# Altium footprint library RevA2.PcbLib: 57 footprints (part 1 of 4)
Each footprint in its own frame and in the unit in brackets; x right, y up, seen from the top. Pads: shape width x height; smd on the part's side, far side on the other; paste and mask are expansions set on the pad; w line width, h text height; cw(c..) or ccw(c..) is an arc to the next point about the centre after c.
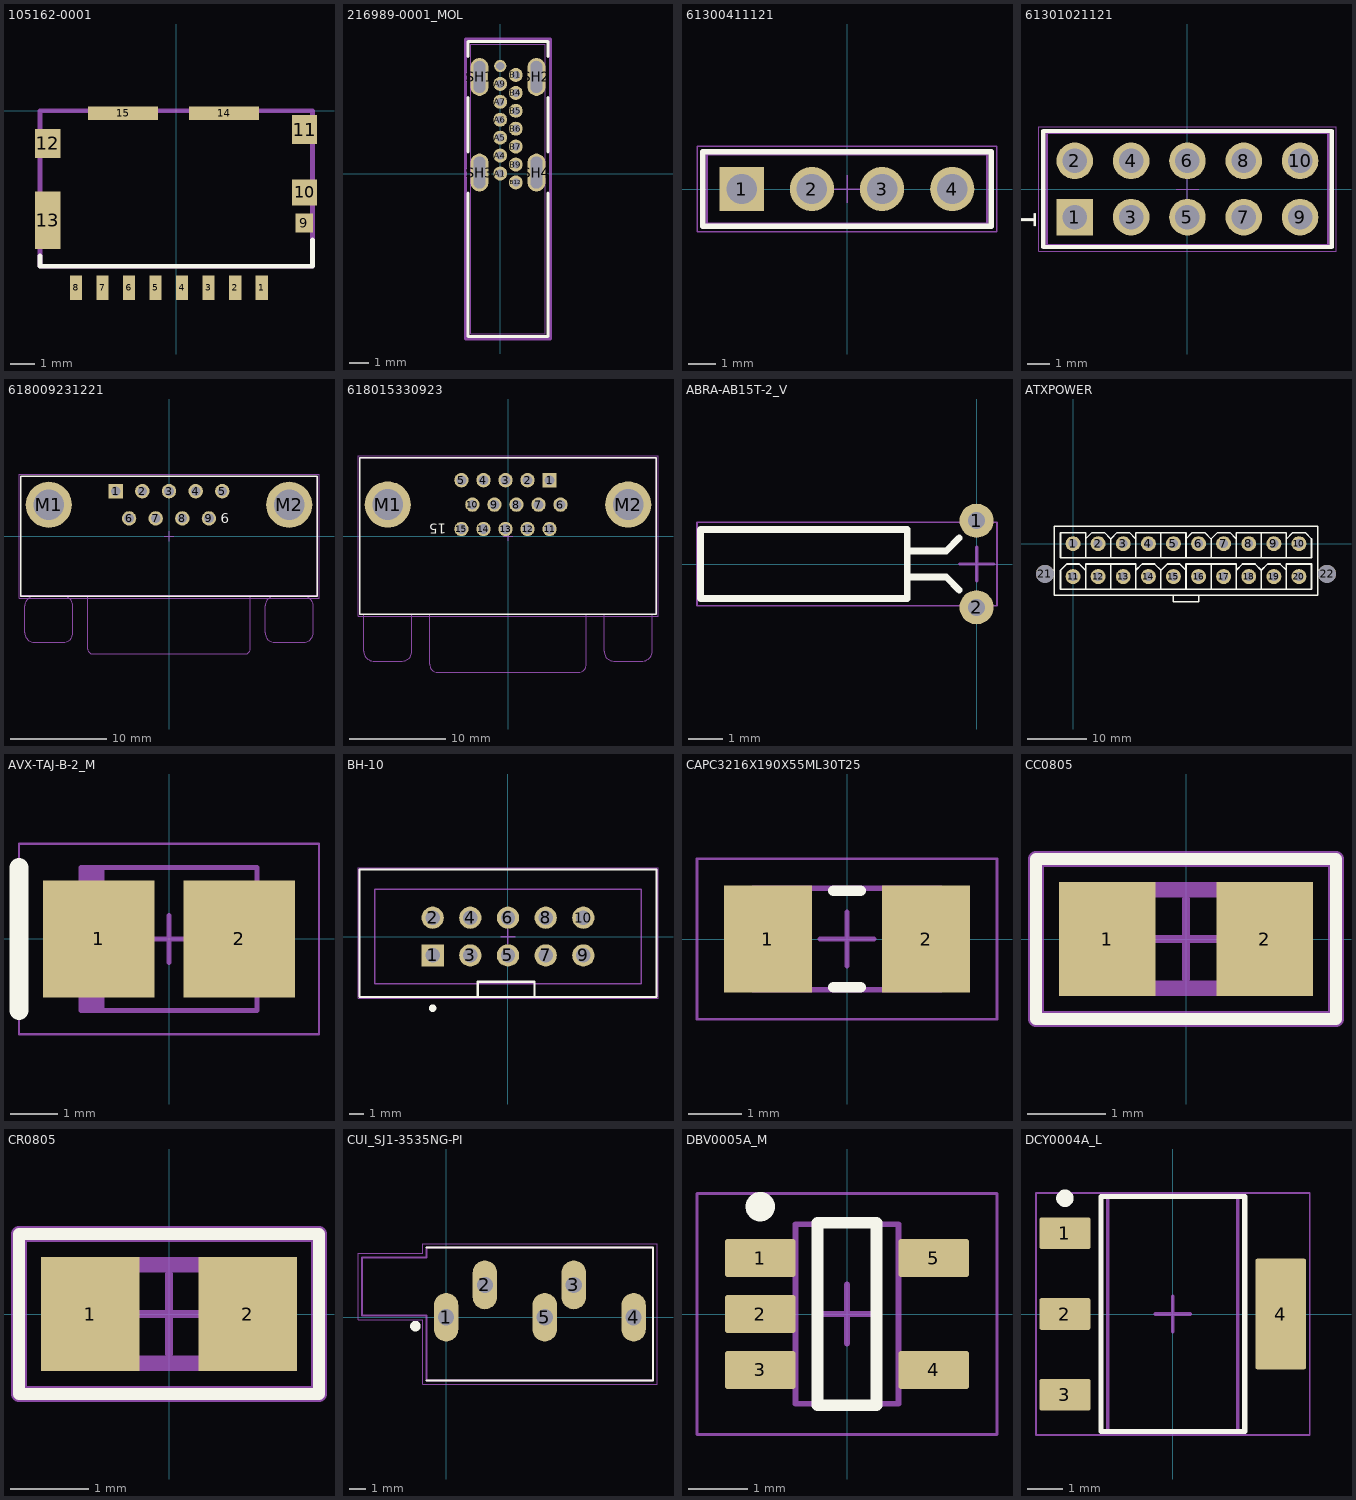
[diagram p0: the footprints below, top view; thin cyan lines are the x and y axes]

## 105162-0001 [mm]
height 2.8
pads (15):
  rect 0.5x1 smd: 1(3.55,-7.34) 2(2.45,-7.34) 3(1.35,-7.34) 4(0.25,-7.34) 5(-0.85,-7.34) 6(-1.95,-7.34) 7(-3.05,-7.34) 8(-4.15,-7.34)
  rect 0.72x0.78 smd: 9(5.31,-4.66)
  rect 1.05x1.08 smd: 10(5.325,-3.39)
  rect 1.05x1.2 smd: 11(5.325,-0.78) 12(-5.325,-1.35)
  rect 1.05x2.39 smd: 13(-5.325,-4.535)
  rect 2.91x0.55 smd: 14(1.986,-0.105) 15(-2.204,-0.105)
Top Overlay:
  lines w0.2: -5.65,-6.028 -5.65,-6.45 5.65,-6.45 5.65,-5.355
Mechanical 13:
  lines w0.2: -5.65,-6.45 5.65,-6.45 5.65,0 -5.65,0 -5.65,-6.45
3D body "1051620001--3DModel-STEP-56544.STEP": height 1.45, standoff 0, extent -5.65,-7.61 5.65,-0.01

## 216989-0001_MOL [mm]
height 3.6
pads (18):
  round 0.7 hole 0.4 mask+0: A1(0,0) A4(0,0.9) A5(0,1.8) A6(0,2.7) A7(0,3.6) A9(0,4.5) B1(0.78,4.95) B4(0.78,4.05) B5(0.78,3.15) B6(0.78,2.25) B7(0.78,1.35) B9(0.78,0.45) B12(0.78,-0.45)
  round 0.61 hole 0.406 mask+0: A12(0,5.4)
  oval 0.9x1.9 hole 0.6 slot 1.6 at 90 deg: SH1(-1.04,4.85) SH2(1.82,4.85) SH3(-1.04,0.05) SH4(1.82,0.05)
Top Overlay:
  lines w0.152: -1.617,-0.979 -1.617,-8.181 2.397,-8.181 2.397,-0.979 ; -1.617,1.079 -1.617,3.821 ; -1.617,5.879 -1.617,6.627 2.397,6.627 2.397,5.879 ; 2.397,1.079 2.397,3.821
Mechanical 13:
  lines w0.025: -1.49,-8.054 2.27,-8.054 2.27,6.5 -1.49,6.5 -1.49,-8.054
Mechanical 15:
  lines w0.152: -1.744,-8.308 -1.744,6.754 2.524,6.754 2.524,-8.308 -1.744,-8.308
3D body: height 0.25, standoff 0, extent 0,0 0.254,0.254
3D body "2169890001.stp": height 9.07, standoff -2.47, extent -1.481,-8.027 2.279,6.623

## 61300411121 [mm] "Pin Header, pitch 2.54 mm, THT, Vertical, single row, 4p"
height 8.54
pads (4):
  rect 1.6x1.6 hole 1.1: 1(-3.81,0)
  round 1.6 hole 1.1: 2(-1.27,0) 3(1.27,0) 4(3.81,0)
Top Overlay:
  lines w0.2: -5.23,-1.345 -5.23,1.345 5.23,1.345 5.23,-1.345 -5.23,-1.345
Mechanical 13:
  lines w0.1: -5.08,-1.27 5.08,-1.27 5.08,1.27 -5.08,1.27 -5.08,-1.27
Mechanical 15:
  lines w0.05: -0.5,0 0.5,0 ; 0,-0.5 0,0.5 ; -5.43,-1.545 5.43,-1.545 5.43,1.545 -5.43,1.545 -5.43,-1.545
3D body "61300411121.stp": height 8.57, standoff -2.97, extent -5.08,-1.27 5.08,1.27

## 61301021121 [mm] "Pin Header, pitch 2.54 mm, THT, Vertical, dual row, 10p"
height 8.54
pads (10):
  rect 1.65x1.65 hole 1.1: 1(-5.08,-1.27)
  round 1.65 hole 1.1: 2(-5.08,1.27) 3(-2.54,-1.27) 4(-2.54,1.27) 5(0,-1.27) 6(0,1.27) 7(2.54,-1.27) 8(2.54,1.27) 9(5.08,-1.27) 10(5.08,1.27)
Top Overlay:
  lines w0.2: -6.5,-2.615 -6.5,2.615 6.5,2.615 6.5,-2.615 -6.5,-2.615
  text "1" at -6.83,-1.853 h1.02
Mechanical 13:
  lines w0.1: -6.35,-2.54 -6.35,2.54 6.35,2.54 6.35,-2.54 -6.35,-2.54
Mechanical 15:
  lines w0.05: -0.5,0 0.5,0 ; 0,-0.5 0,0.5 ; -6.7,-2.815 6.7,-2.815 6.7,2.815 -6.7,2.815 -6.7,-2.815
3D body "61301021121.stp": height 8.59, standoff -2.95, extent -6.35,-2.54 6.35,2.54

## 618009231221 [mm] "9 pins, right angled, 8.08mm, with hex screw"
height 12.5
pads (11):
  rect 1.5x1.5 hole 1: 1(-5.54,4.69)
  round 1.5 hole 1: 2(-2.77,4.69) 3(0,4.69) 4(2.77,4.69) 5(5.54,4.69) 6(-4.155,1.85) 7(-1.385,1.85) 8(1.385,1.85) 9(4.155,1.85)
  round 4.8 hole 3.2: M1(-12.5,3.27) M2(12.5,3.27)
Top Overlay:
  lines w0.15: -15.4,-6.25 -15.4,6.25 15.4,6.25 15.4,-6.25 -15.4,-6.25
  text "9" at 6.29,2.38 h1.02
Mechanical 2:
  lines w0.1: -15.4,-6.15 15.4,-6.15
  text "PCB Edge" at 0,0 h1.02
Mechanical 13:
  lines w0.1: -14,-6.25 ccw(c-14,-7.25) -15,-7.25 -15,-10.05 ccw(c-14,-10.05) -14,-11.05 -11,-11.05 ccw(c-11,-10.05) -10,-10.05 -10,-7.25 ccw(c-11,-7.25) -11,-6.25 ; -8.46,-6.25 -8.46,-11.73 ccw(c-7.96,-11.73) -7.96,-12.23 7.94,-12.23 ; 7.96,-12.23 ccw(c7.96,-11.73) 8.46,-11.73 8.46,-6.25 ; 11,-6.25 ccw(c11,-7.25) 10,-7.25 10,-10.05 ccw(c11,-10.05) 11,-11.05 14,-11.05 ccw(c14,-10.05) 15,-10.05 15,-7.25 ccw(c14,-7.25) 14,-6.25 ; -15.4,-6.25 15.4,-6.25 15.4,6.25 -15.4,6.25 -15.4,-6.25 ; 7.95,-12.23 7.95,-12.23
Mechanical 15:
  lines w0.05: -0.5,0 0.5,0 ; 0,-0.5 0,0.5 ; -15.6,-6.45 15.6,-6.45 15.6,6.45 -15.6,6.45 -15.6,-6.45
3D body "618009231221.stp": height 12.55, standoff -3.8, extent -15.405,-12.25 15.405,6.25

## 618015330923 [mm] "15 pins, right angled"
height 12.5
pads (17):
  rect 1.5x1.5 hole 1: 1(4.32,5.82)
  round 1.5 hole 1: 2(2.03,5.82) 3(-0.26,5.82) 4(-2.55,5.82) 5(-4.84,5.82) 6(5.46,3.28) 7(3.17,3.28) 8(0.88,3.28) 9(-1.41,3.28) 10(-3.7,3.28) 11(4.32,0.74) 12(2.03,0.74) 13(-0.26,0.74) 14(-2.55,0.74) 15(-4.84,0.74)
  round 4.8 hole 3.2: M1(-12.5,3.28) M2(12.5,3.28)
Top Overlay:
  lines w0.15: -15.4,-8.15 15.4,-8.15 15.4,8.15 -15.4,8.15 -15.4,-8.15
  text "15" at -6.43,1.27 h1.02
Mechanical 2:
  lines w0.1: -15.4,-8.15 15.4,-8.15
  text "PCB Edge" at 0,0 h1.02
Mechanical 13:
  lines w0.1: -15,-8.15 -15,-11.99 ccw(c-14,-11.99) -14,-12.99 -11,-12.99 ccw(c-11,-11.99) -10,-11.99 -10,-8.15 ; -8.15,-8.15 -8.15,-13.35 ccw(c-7.35,-13.35) -7.35,-14.15 7.35,-14.15 ccw(c7.35,-13.35) 8.15,-13.35 8.15,-8.15 ; 10,-8.15 10,-11.99 ccw(c11,-11.99) 11,-12.99 14,-12.99 ccw(c14,-11.99) 15,-11.99 15,-8.15 ; -15.4,-8.15 -15.4,8.15 15.4,8.15 15.4,-8.15 -15.4,-8.15
Mechanical 15:
  lines w0.05: -0.5,0 0.5,0 ; 0,-0.5 0,0.5 ; -15.6,-8.35 15.6,-8.35 15.6,8.35 -15.6,8.35 -15.6,-8.35
3D body "618015330923.stp": height 12.55, standoff -3.95, extent -15.4,-14.15 15.4,8.15

## ABRA-AB15T-2_V [mm] "THD, 2-Leads, Body 5.1x1.5mm, Height 1.5mm"
height 1.5
pads (2):
  round 1 hole 0.5: 1(0,1.27) 2(0,-1.27)
Top Overlay:
  lines w0.2: -2.032,-0.381 -0.889,-0.381 -0.508,-0.762 ; -2.032,0.381 -0.889,0.381 -0.508,0.762 ; -8.1,-1.016 -8.1,1.016 -2.032,1.016 -2.032,-1.016 -8.1,-1.016
Mechanical 13:
  lines w0.1: -8.1,-1.016 -8.1,1.016 -2.032,1.016 -2.032,-1.016 -8.1,-1.016
Mechanical 15:
  lines w0.05: -8.2,-1.227 0.6,-1.227 0.6,1.227 -8.2,1.227 -8.2,-1.227
  lines w0.1: -0.5,0 0.5,0 ; 0,-0.5 0,0.5
3D body "User Library-XTAL.step": height 2.15, standoff -1.77, extent -8.285,-1.392 0.096,1.39

## ATXPOWER [mm]
pads (22):
  round 2.5 hole 1.5: 1(0,0) 2(4.2,0) 3(8.4,0) 4(12.6,0) 5(16.8,0) 6(21,0) 7(25.2,0) 8(29.4,0) 9(33.6,0) 10(37.8,0) 11(0,-5.5) 12(4.2,-5.5) 13(8.4,-5.5) 14(12.6,-5.5) 15(16.8,-5.5) 16(21,-5.5) 17(25.2,-5.5) 18(29.4,-5.5) 19(33.6,-5.5) 20(37.8,-5.5)
  round 3 hole 3 unplated: 21(-4.7,-5.04) 22(42.5,-5.04)
Top Overlay:
  lines w0.254: -3.65,-4.376 ccw(c-4.6,-4.97) -3.598,-5.472 ; -3.556,-5.334 -3.175,-5.334 ; -3.556,-4.445 -3.175,-4.445 ; 2.1,0.8 3.15,1.85 5.25,1.85 6.3,0.8 ; 10.5,-4.45 11.55,-3.4 13.65,-3.4 14.7,-4.45 ; 16.8,-8.65 16.8,-9.7 21,-9.7 21,-8.65 ; 41.021,-5.334 41.402,-5.334 ; 41.021,-4.445 41.402,-4.445 ; 41.444,-5.472 ccw(c42.446,-4.97) 41.496,-4.376 ; 2.1,-7.6 2.1,-4.45 ; 2.1,-7.6 -2.1,-7.6 -2.1,-4.45 -1.05,-3.4 1.05,-3.4 2.1,-4.45 ; 2.1,-7.6 6.3,-7.6 ; 2.1,-4.45 2.1,-3.4 6.3,-3.4 ; 2.1,-2.35 -2.1,-2.35 -2.1,1.85 2.1,1.85 2.1,-2.35 ; 2.1,-2.35 6.3,-2.35 ; 6.3,-7.6 6.3,-3.4 ; 6.3,-7.6 10.5,-7.6 ; 6.3,-3.4 10.5,-3.4 10.5,-7.6 ; 6.3,-2.35 6.3,0.8 ; 6.3,-2.35 10.5,-2.35 ; 6.3,0.8 7.35,1.85 9.45,1.85 10.5,0.8 ; 10.5,-7.6 14.7,-7.6 ; 10.5,-2.35 14.7,-2.35 ; 10.5,-2.35 10.5,0.8 ; 10.5,0.8 10.5,1.85 14.7,1.85 ; 14.7,-7.6 14.7,-4.45 ; 14.7,-7.6 18.9,-7.6 ; 14.7,-4.45 15.75,-3.4 17.85,-3.4 18.9,-4.45 ; 14.7,-2.35 14.7,1.85 ; 14.7,-2.35 18.9,-2.35 ; 14.7,1.85 18.9,1.85 18.9,-2.35 ; 18.9,-7.6 18.9,-4.45 ; 18.9,-7.6 23.1,-7.6 ; 18.9,-4.45 18.9,-3.4 23.1,-3.4 ; 18.9,-2.35 23.1,-2.35 ; 18.9,-2.35 18.9,0.8 19.95,1.85 22.05,1.85 23.1,0.8 ; 23.1,-7.6 23.1,-3.4 ; 23.1,-7.6 27.3,-7.6 ; 23.1,-3.4 27.3,-3.4 27.3,-7.6 ; 23.1,-2.35 23.1,0.8 ; 23.1,-2.35 23.1,0.8 ; 23.1,-2.35 27.3,-2.35 ; 23.1,0.8 24.15,1.85 26.25,1.85 27.3,0.8 ; 27.3,-7.6 27.3,-4.45 28.35,-3.4 30.45,-3.4 31.5,-4.45 ; 27.3,-7.6 31.5,-7.6 ; 27.3,-2.35 31.5,-2.35 ; 27.3,-2.35 27.3,0.8 ; 27.3,0.8 27.3,1.85 31.5,1.85 ; 31.5,-7.6 31.5,-4.45 ; 31.5,-7.6 35.7,-7.6 ; 31.5,-4.45 32.55,-3.4 34.65,-3.4 35.7,-4.45 35.7,-7.6 ; 31.5,-2.35 31.5,1.85 ; 31.5,-2.35 35.7,-2.35 ; 31.5,1.85 35.7,1.85 35.7,-2.35 ; 35.7,-7.6 35.7,-3.4 39.9,-3.4 39.9,-7.6 35.7,-7.6 ; 35.7,-2.35 39.9,-2.35 39.9,0.8 38.85,1.85 36.75,1.85 35.7,0.8 35.7,-2.35 ; -3.15,-8.65 -3.15,2.9 40.95,2.9 40.95,-8.65 -3.15,-8.65
3D body "c-2-1775099-7-e-3d.stp": height 13, standoff -3, extent -5.7,-8.8 43.5,2.1

## AVX-TAJ-B-2_M [mm] "Molded Capacitor, 2-Leads, Body 3.7x3mm, IPC Low Density"
height 2.1
pads (2):
  rect 2.35x2.45 smd: 1(-1.475,0) 2(1.475,0)
Top Overlay:
  lines w0.4: -3.15,-1.5 -3.15,1.5
Top Value:
  text ".Value" at 1.516,0.219 h1.25
Mechanical 13:
  rectangle: -1.85,-1.5 -1.352,1.5
  lines w0.1: -1.85,-1.5 1.85,-1.5 1.85,1.5 -1.85,1.5 -1.85,-1.5
Mechanical 15:
  lines w0.05: -3.15,-2 3.15,-2 3.15,2 -3.15,2 -3.15,-2
  lines w0.1: -0.5,0 0.5,0 ; 0,-0.5 0,0.5
3D body "CAPMP3529X21M.step": height 2.1, standoff 0, extent -2.07,-1.5 2.07,1.5

## BH-10 [mm] "Header, 10-Leads, Body 20.02x8.59mm, Pitch 2.54mm"
height 9.91
pads (10):
  rect 1.5x1.5 hole 0.97: 1(-5.08,-1.27)
  round 1.5 hole 0.97: 2(-5.08,1.27) 3(-2.54,-1.27) 4(-2.54,1.27) 5(0,-1.27) 6(0,1.27) 7(2.54,-1.27) 8(2.54,1.27) 9(5.08,-1.27) 10(5.08,1.27)
Top Overlay:
  circle w0.25: c-5.08,-4.826 r0.125
  lines w0.15: -2.032,-4.064 -2.032,-3.048 1.778,-3.048 1.778,-4.064 ; -10.01,-4.07 10.01,-4.07 10.01,4.52 -10.01,4.52 -10.01,-4.07
Mechanical 13:
  lines w0.1: -10.01,-4.07 -10.01,4.52 10.01,4.52 10.01,-4.07 -10.01,-4.07 ; -8.99,-3.175 8.99,-3.175 8.99,3.175 -8.99,3.175 -8.99,-3.175
Mechanical 15:
  lines w0.05: -10.11,-4.17 10.11,-4.17 10.11,4.62 -10.11,4.62 -10.11,-4.17
  lines w0.1: -0.5,0 0.5,0 ; 0,-0.5 0,0.5
3D body "User Library-BH-10 (IDC-10MS).step": height 9.03, standoff -2.97, extent -10.155,-4.582 10.145,4.518

## CAPC3216X190X55ML30T25 [mm] "Chip Capacitor, 2-Leads, Body 3.5x1.9mm, IPC Low Density"
height 1.9
pads (2):
  rect 1.65x2 smd: 1(-1.475,0) 2(1.475,0)
Top Overlay:
  lines w0.2: -0.25,-0.9 0.25,-0.9 ; -0.25,0.9 0.25,0.9
Top Value:
  text ".Value" at -1.512,-0.394 h1.25
Mechanical 13:
  lines w0.1: -1.75,-0.95 -1.75,0.95 1.75,0.95 1.75,-0.95 -1.75,-0.95
Mechanical 15:
  lines w0.05: -2.8,-1.5 -2.8,1.5 2.8,1.5 2.8,-1.5 -2.8,-1.5
  lines w0.1: -0.5,0 0.5,0 ; 0,-0.5 0,0.5
3D body "CAPC3216X19M.step": height 1.9, standoff 0, extent -1.75,-0.95 1.75,0.95

## CC0805 [mm]
height 1.5
pads (2):
  rect 1.22x1.45 smd paste+0: 1(-1,0) 2(1,0)
Top Overlay:
  lines w0.15: -1.905,-1.016 -1.905,1.016 1.905,1.016 1.905,-1.016 -1.905,-1.016
Top Value:
  text ".Value" at 1.494,0.444 h1.25
Top 3D Body:
  lines w0.2: -1,-0.625 -1,0.625 1,0.625 1,-0.625 -1,-0.625
Top Courtyard:
  lines w0.2: -1.905,-1.016 -1.905,1.016 1.905,1.016 1.905,-1.016 -1.905,-1.016
Top Assembly:
  lines w0.2: -1.905,-1.016 -1.905,1.016 1.905,1.016 1.905,-1.016 -1.905,-1.016
  text ".Value" at -1.016,-0.243 h1
Top Component Center:
  lines w0.1: -0.5,0 0.5,0 ; 0,-0.5 0,0.5
3D body "User Library-C0805-2.step": height 0.8, standoff 0, extent -1,-0.625 1,0.625

## CR0805 [mm]
height 1.5
pads (2):
  rect 1.25x1.45 smd paste+0: 1(-1,0) 2(1,0)
Top Overlay:
  lines w0.15: -1.905,-1.016 1.905,-1.016 1.905,1.016 -1.905,1.016 -1.905,-1.016
Top Value:
  text ".Value" at -1.512,-0.394 h1.25
Top 3D Body:
  lines w0.2: -1,-0.625 1,-0.625 1,0.625 -1,0.625 -1,-0.625
Top Courtyard:
  lines w0.2: -1.905,-1.016 1.905,-1.016 1.905,1.016 -1.905,1.016 -1.905,-1.016
Top Assembly:
  lines w0.2: -1.905,-1.016 -1.905,1.016 1.905,1.016 1.905,-1.016 -1.905,-1.016
  text ".Value" at -1.016,-0.243 h1
Top Component Center:
  lines w0.1: -0.5,0 0.5,0 ; 0,-0.5 0,0.5
3D body "Res_Stackpole_Electronics_RMCF0805JT220K_eec.STEP": height 0.65, standoff 0, extent -1,-0.625 1,0.625

## CUI_SJ1-3535NG-PI [mm]
pads (5):
  oval 1.508x3.016 hole 1 square: 1(0,0) 2(2.4,2) 3(7.9,2) 4(11.6,0) 5(6.1,0)
Top Overlay:
  circle w0.35: c-1.9,-0.55 r0.15
  lines w0.127: -1.2,-3.9 12.8,-3.9 12.8,4.3 -1.2,4.3
Mechanical 13:
  lines w0.127: -5.2,0.1 -5.2,3.7 -1.2,3.7 -1.2,4.3 12.8,4.3 12.8,-3.9 -1.2,-3.9 -1.2,0.1 -5.2,0.1
Mechanical 15:
  lines w0.05: -5.45,-0.15 -5.45,3.95 -1.45,3.95 -1.45,4.55 13.05,4.55 13.05,-4.15 -1.45,-4.15 -1.45,-0.15 -5.45,-0.15
3D body "CUI_DEVICES_SJ1-3535NG-PI.step": height 12.3, standoff -3.3, extent -5.215,-4.064 12.835,4.136

## DBV0005A_M [mm] "SOT23, 5-Leads, Body 3.05x1.75mm, Pitch 0.95mm, IPC Low Density"
height 1.45
pads (5):
  rrect15% 1.2x0.65 smd: 1(-1.475,0.95) 2(-1.475,0) 3(-1.475,-0.95) 4(1.475,-0.95) 5(1.475,0.95)
Top Overlay:
  circle w0.25: c-1.475,1.825 r0.125
  lines w0.2: -0.5,-1.55 0.5,-1.55 0.5,1.55 -0.5,1.55 -0.5,-1.55
Mechanical 1:
  text ".Designator" at -0.635,-0.127 h0.4
Mechanical 13:
  lines w0.1: -0.875,-1.525 -0.875,1.525 0.875,1.525 0.875,-1.525 -0.875,-1.525
Mechanical 15:
  lines w0.05: -2.55,-2.05 -2.55,2.05 2.55,2.05 2.55,-2.05 -2.55,-2.05
  lines w0.1: -0.5,0 0.5,0 ; 0,-0.5 0,0.5
3D body "DBV0005AaksMF05A.stp": height 1.08, standoff -0.01, extent -1.422,-1.461 1.422,1.46

## DCY0004A_L [mm] "SOT223, 4-Leads, Body 6.7x3.7mm, Pitch 2.3mm, IPC High Density"
height 1.8
pads (4):
  rrect11% 1.45x0.9 smd: 1(-3.075,2.3) 2(-3.075,0) 3(-3.075,-2.3)
  rrect7% 1.45x3.15 smd: 4(3.075,0)
Top Overlay:
  circle w0.25: c-3.075,3.3 r0.125
  lines w0.15: -2.05,-3.35 -2.05,3.35 2.05,3.35 2.05,-3.35 -2.05,-3.35
Mechanical 1:
  text ".Designator" at 0,0 h0.8
Mechanical 13:
  lines w0.1: -1.85,-3.35 -1.85,3.35 1.85,3.35 1.85,-3.35 -1.85,-3.35
Mechanical 15:
  lines w0.05: -3.9,-3.45 -3.9,3.45 3.9,3.45 3.9,-3.45 -3.9,-3.45
  lines w0.1: -0.5,0 0.5,0 ; 0,-0.5 0,0.5
3D body "SOT-223.stp": height 1.62, standoff -0.03, extent -3.5,-3.25 3.5,3.25